# Altium footprint library SparkFun-Retired.PCBLIB: 302 footprints (part 3 of 19)
Each footprint in its own frame and in the unit in brackets; x right, y up, seen from the top. Pads: shape width x height; smd on the part's side, far side on the other; paste and mask are expansions set on the pad; w line width, h text height; cw(c..) or ccw(c..) is an arc to the next point about the centre after c.
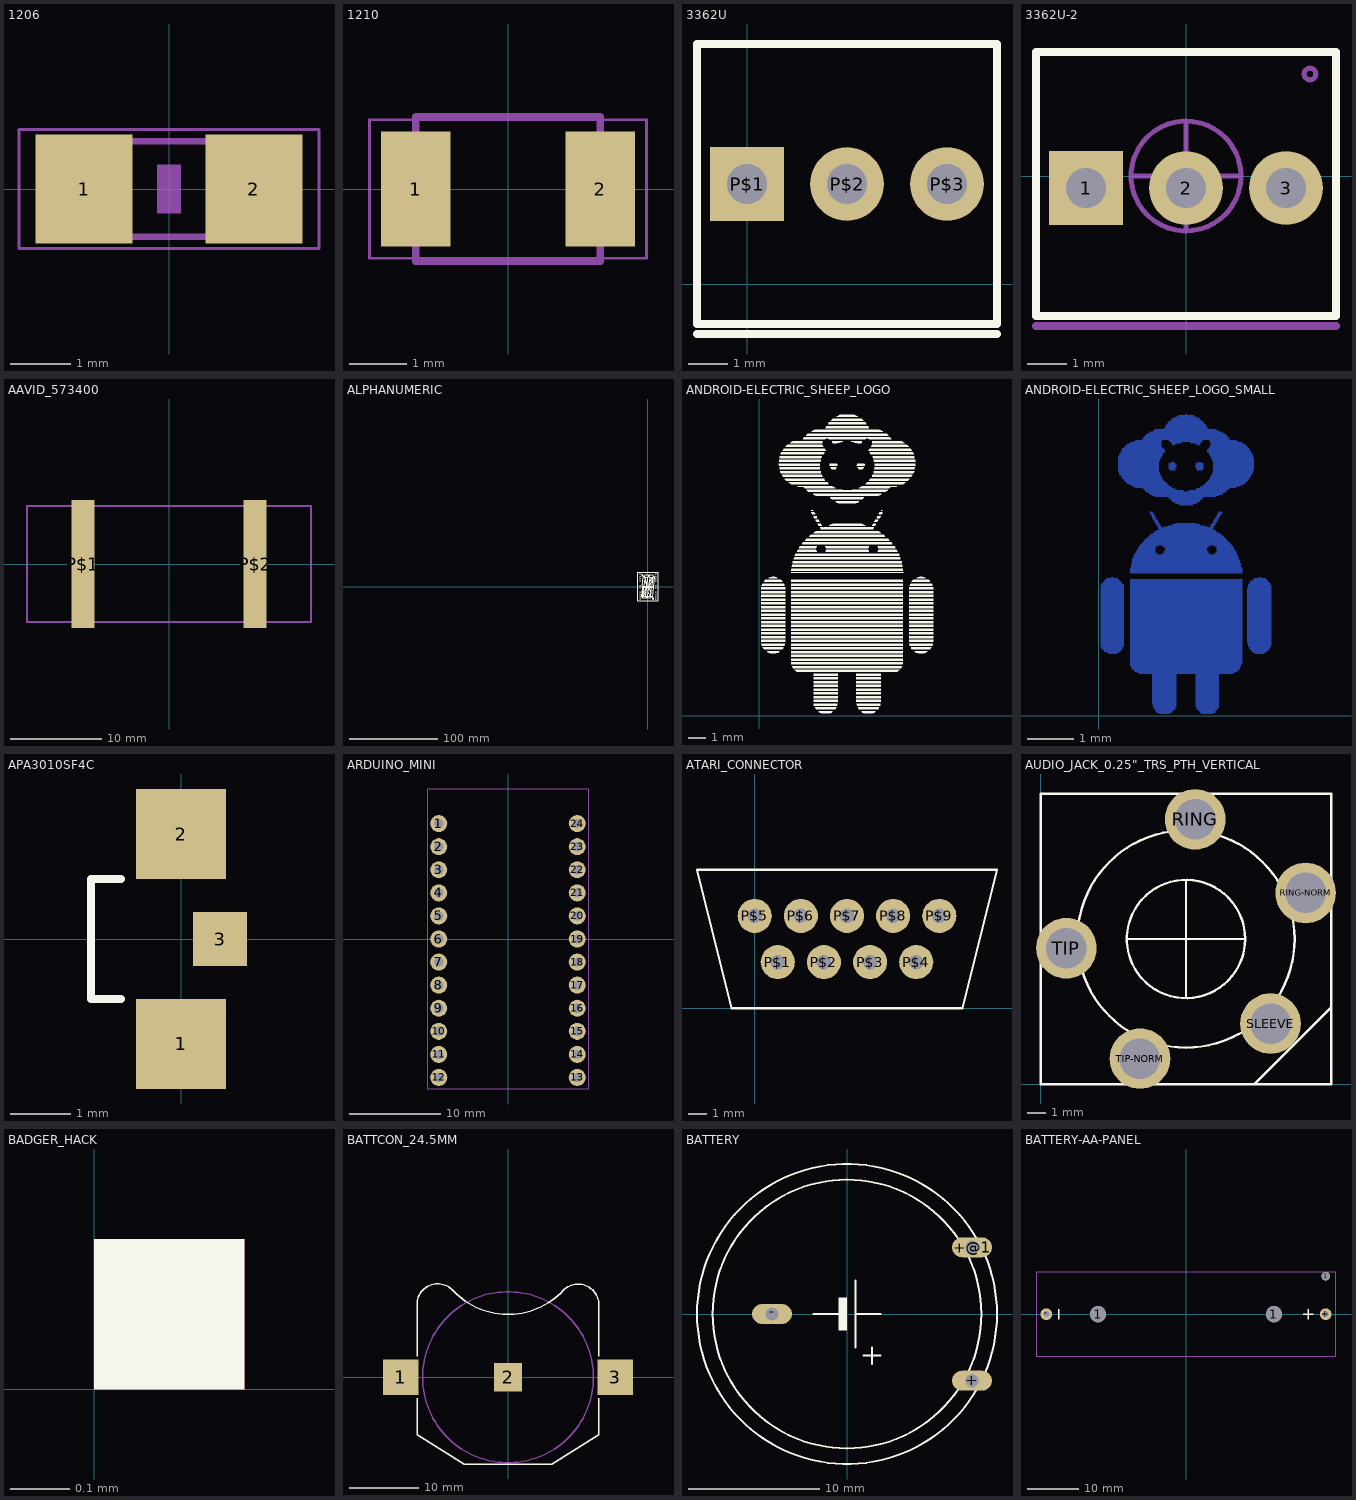
[diagram p2: the footprints below, top view; thin cyan lines are the x and y axes]

## 1206 [mil]
pads (2):
  rect 62.99x70.87 smd: 1(-55.12,0) 2(55.12,0)
Mechanical 6:
  rectangle: -7.87,-15.75 7.87,15.75
Mechanical 16:
  rectangle: -67,-33.5 -37.47,33.43
  rectangle: 37.47,-33.43 67,33.5
  lines w4: -37.99,-30.98 37.99,-30.98 ; -37.99,30.98 37.99,30.98
Mechanical 27:
  lines w2: -97.36,-38.7 97.36,-38.7 97.36,38.7 -97.36,38.7 -97.36,-38.7

## 1210 [mm]
pads (2):
  rect 1.2x2 smd: 1(-1.6,0) 2(1.6,0)
Mechanical 16:
  lines w0.127: -1.6,-1.25 1.6,-1.25 1.6,1.25 -1.6,1.25 -1.6,-1.25
Mechanical 27:
  lines w0.051: -2.4,-1.2 2.4,-1.2 2.4,1.2 -2.4,1.2 -2.4,-1.2

## 3362U [mil]
pads (3):
  rect 74x74 hole 40: P$1(0,100)
  round 74 hole 40: P$2(100,100) P$3(200,100)
Top Overlay:
  lines w8: -50,-50 250,-50 ; -50,-40 250,-40 250,240 -50,240 -50,-40

## 3362U-2 [mil]
pads (3):
  rect 74x74 hole 40: 1(-100,-12)
  round 74 hole 40: 2(0,-12) 3(100,-12)
Top Overlay:
  lines w8: -150,-140 150,-140 150,124 -150,124 -150,-140
Mechanical 16:
  circle w5: c0,0 r55
  circle w5: c124,102 r5.83
  lines w5: -55,0 55,0 ; 0,-55 0,55
  lines w8: -150,-150 150,-150

## AAVID_573400 [mil]
pads (2):
  rect 100x550 smd: P$1(-370,0) P$2(370,0)
Mechanical 16:
  rectangle: -395,-250 -345,250
  rectangle: 345,-250 395,250
  lines w8: -610,-250 610,-250 610,250 -610,250 -610,-250

## ALPHANUMERIC [mil]
pads (20):
  round 66.93 hole 35.43: 1(-350,550) 2(-350,450) 3(-350,350) 4(-350,250) 6(-350,50) 7(-350,-50) 9(-350,-250) 10(-350,-350) 11(-350,-450) 12(-350,-550) 13(350,-550) 14(350,-450) 15(350,-350) 16(350,-250) 18(350,-50) 19(350,50) 21(350,250) 22(350,350) 23(350,450) 24(350,550)
Top Overlay:
  circle w8: c-250,510 r29.15
  circle w8: c230,-525 r26.93
  lines w8: -450,-650 450,-650 450,650 -450,650 -450,-650 ; -300,-425 -260,-35 -215,-35 -190,-70 -225,-400 -275,-450 -300,-425 ; -270,-485 -230,-440 -110,-440 -75,-475 -75,-505 -250,-505 -270,-485 ; -255,5 -210,5 -175,45 -135,400 -190,460 -210,425 -255,5 ; -205,-400 -95,-215 -75,-75 -190,-255 -205,-400 ; -195,-15 -170,-50 -75,-50 -30,-15 -60,25 -160,25 -195,-15 ; -175,475 -125,425 -5,425 35,465 35,500 -150,500 -175,475 ; -130,255 ccw(c-6492.5,1007.5) -115,395 -40,180 -55,50 -130,255 ; -100,-415 -65,-450 -30,-415 15,-75 -10,-25 -55,-70 -100,-415 ; -50,-505 -50,-475 -20,-440 105,-440 155,-480 135,-505 -50,-505 ; -35,45 -5,0 30,45 75,415 45,450 5,410 -35,45 ; 15,-15 40,-55 145,-55 185,-15 150,25 55,25 15,-15 ; 20,-225 105,-415 120,-280 35,-75 20,-225 ; 50,45 185,265 200,395 70,180 50,45 ; 55,460 55,500 240,500 255,470 220,425 90,425 55,460 ; 125,-420 170,-455 195,-440 245,-30 200,-30 160,-70 125,-420 ; 175,40 205,0 250,0 300,415 275,460 220,400 175,40

## ANDROID-ELECTRIC_SHEEP_LOGO [mil]
Top Overlay:
  drawing of 1370 lines, arcs and shapes, not listed

## ANDROID-ELECTRIC_SHEEP_LOGO_SMALL [mil]
Bottom Layer:
  rectangle: 51.5,1.5 60.5,2.5
  rectangle: 87.5,1.5 97.5,2.5
  rectangle: 49.5,2.5 62.5,3.5
  rectangle: 86.5,2.5 99.5,3.5
  rectangle: 48.5,3.5 63.5,4.5
  rectangle: 85.5,3.5 99.5,4.5
  rectangle: 47.5,4.5 64.5,5.5
  rectangle: 84.5,4.5 101.5,5.5
  rectangle: 47.5,5.5 65.5,6.5
  rectangle: 83.5,5.5 101.5,6.5
  rectangle: 46.5,6.5 65.5,7.5
  rectangle: 83.5,6.5 102.5,7.5
  rectangle: 46.5,7.5 66.5,8.5
  rectangle: 82.5,7.5 102.5,8.5
  rectangle: 46.5,8.5 66.5,9.5
  rectangle: 82.5,8.5 102.5,9.5
  rectangle: 45.5,9.5 66.5,10.5
  rectangle: 82.5,9.5 102.5,10.5
  rectangle: 45.5,10.5 66.5,11.5
  rectangle: 82.5,10.5 102.5,11.5
  rectangle: 45.5,11.5 66.5,12.5
  rectangle: 82.5,11.5 102.5,12.5
  rectangle: 45.5,12.5 66.5,13.5
  rectangle: 82.5,12.5 102.5,13.5
  rectangle: 45.5,13.5 66.5,14.5
  rectangle: 82.5,13.5 102.5,14.5
  rectangle: 45.5,14.5 66.5,15.5
  rectangle: 82.5,14.5 102.5,15.5
  rectangle: 45.5,15.5 66.5,16.5
  rectangle: 82.5,15.5 102.5,16.5
  rectangle: 45.5,16.5 66.5,17.5
  rectangle: 82.5,16.5 102.5,17.5
  rectangle: 45.5,17.5 66.5,18.5
  rectangle: 82.5,17.5 102.5,18.5
  rectangle: 45.5,18.5 66.5,19.5
  rectangle: 82.5,18.5 102.5,19.5
  rectangle: 45.5,19.5 66.5,20.5
  rectangle: 82.5,19.5 102.5,20.5
  rectangle: 45.5,20.5 66.5,21.5
  rectangle: 82.5,20.5 102.5,21.5
  rectangle: 45.5,21.5 66.5,22.5
  rectangle: 82.5,21.5 102.5,22.5
  rectangle: 45.5,22.5 66.5,23.5
  rectangle: 82.5,22.5 102.5,23.5
  rectangle: 45.5,23.5 66.5,24.5
  rectangle: 82.5,23.5 102.5,24.5
  rectangle: 45.5,24.5 66.5,25.5
  rectangle: 82.5,24.5 102.5,25.5
  rectangle: 45.5,25.5 66.5,26.5
  rectangle: 82.5,25.5 102.5,26.5
  rectangle: 45.5,26.5 66.5,27.5
  rectangle: 82.5,26.5 102.5,27.5
  rectangle: 45.5,27.5 66.5,28.5
  rectangle: 82.5,27.5 102.5,28.5
  rectangle: 45.5,28.5 66.5,29.5
  rectangle: 82.5,28.5 102.5,29.5
  rectangle: 45.5,29.5 66.5,30.5
  rectangle: 82.5,29.5 102.5,30.5
  rectangle: 45.5,30.5 66.5,31.5
  rectangle: 82.5,30.5 102.5,31.5
  rectangle: 45.5,31.5 66.5,32.5
  rectangle: 82.5,31.5 102.5,32.5
  rectangle: 45.5,32.5 66.5,33.5
  rectangle: 82.5,32.5 102.5,33.5
  rectangle: 45.5,33.5 66.5,34.5
  rectangle: 82.5,33.5 102.5,34.5
  rectangle: 45.5,34.5 66.5,35.5
  rectangle: 82.5,34.5 102.5,35.5
  rectangle: 34.5,35.5 114.5,36.5
  rectangle: 32.5,36.5 116.5,37.5
  rectangle: 30.5,37.5 118.5,38.5
  rectangle: 29.5,38.5 119.5,39.5
  rectangle: 28.5,39.5 120.5,40.5
  rectangle: 27.5,40.5 120.5,41.5
  rectangle: 27.5,41.5 121.5,42.5
  rectangle: 26.5,42.5 121.5,43.5
  rectangle: 26.5,43.5 121.5,44.5
  rectangle: 26.5,44.5 122.5,45.5
  rectangle: 26.5,45.5 122.5,46.5
  rectangle: 26.5,46.5 122.5,47.5
  rectangle: 26.5,47.5 122.5,48.5
  rectangle: 26.5,48.5 122.5,49.5
  rectangle: 26.5,49.5 122.5,50.5
  rectangle: 26.5,50.5 122.5,51.5
  rectangle: 26.5,51.5 122.5,52.5
  rectangle: 8.5,52.5 15.5,53.5
  rectangle: 26.5,52.5 122.5,53.5
  rectangle: 133.5,52.5 140.5,53.5
  rectangle: 6.5,53.5 17.5,54.5
  rectangle: 26.5,53.5 122.5,54.5
  rectangle: 131.5,53.5 142.5,54.5
  rectangle: 4.5,54.5 18.5,55.5
  rectangle: 26.5,54.5 122.5,55.5
  rectangle: 130.5,54.5 143.5,55.5
  rectangle: 3.5,55.5 19.5,56.5
  rectangle: 26.5,55.5 122.5,56.5
  rectangle: 129.5,55.5 145.5,56.5
  rectangle: 2.5,56.5 20.5,57.5
  rectangle: 26.5,56.5 122.5,57.5
  rectangle: 128.5,56.5 145.5,57.5
  rectangle: 2.5,57.5 20.5,58.5
  rectangle: 26.5,57.5 122.5,58.5
  rectangle: 128.5,57.5 146.5,58.5
  rectangle: 1.5,58.5 21.5,59.5
  rectangle: 26.5,58.5 122.5,59.5
  rectangle: 127.5,58.5 146.5,59.5
  rectangle: 1.5,59.5 21.5,60.5
  rectangle: 26.5,59.5 122.5,60.5
  rectangle: 127.5,59.5 147.5,60.5
  rectangle: 1.5,60.5 21.5,61.5
  rectangle: 26.5,60.5 122.5,61.5
  rectangle: 127.5,60.5 147.5,61.5
  rectangle: 1.5,61.5 21.5,62.5
  rectangle: 26.5,61.5 122.5,62.5
  rectangle: 126.5,61.5 147.5,62.5
  rectangle: 1.5,62.5 21.5,63.5
  rectangle: 26.5,62.5 122.5,63.5
  rectangle: 126.5,62.5 147.5,63.5
  rectangle: 1.5,63.5 21.5,64.5
  rectangle: 26.5,63.5 122.5,64.5
  rectangle: 126.5,63.5 147.5,64.5
  rectangle: 1.5,64.5 21.5,65.5
  rectangle: 26.5,64.5 122.5,65.5
  rectangle: 126.5,64.5 147.5,65.5
  rectangle: 1.5,65.5 21.5,66.5
  rectangle: 26.5,65.5 122.5,66.5
  rectangle: 126.5,65.5 147.5,66.5
  rectangle: 1.5,66.5 21.5,67.5
  rectangle: 26.5,66.5 122.5,67.5
  rectangle: 126.5,66.5 147.5,67.5
  rectangle: 1.5,67.5 21.5,68.5
  rectangle: 26.5,67.5 122.5,68.5
  rectangle: 126.5,67.5 147.5,68.5
  rectangle: 1.5,68.5 21.5,69.5
  rectangle: 26.5,68.5 122.5,69.5
  rectangle: 126.5,68.5 147.5,69.5
  rectangle: 1.5,69.5 21.5,70.5
  rectangle: 26.5,69.5 122.5,70.5
  rectangle: 126.5,69.5 147.5,70.5
  rectangle: 1.5,70.5 21.5,71.5
  rectangle: 26.5,70.5 122.5,71.5
  rectangle: 126.5,70.5 147.5,71.5
  rectangle: 1.5,71.5 21.5,72.5
  rectangle: 26.5,71.5 122.5,72.5
  rectangle: 126.5,71.5 147.5,72.5
  rectangle: 1.5,72.5 21.5,73.5
  rectangle: 26.5,72.5 122.5,73.5
  rectangle: 126.5,72.5 147.5,73.5
  rectangle: 1.5,73.5 21.5,74.5
  rectangle: 26.5,73.5 122.5,74.5
  rectangle: 126.5,73.5 147.5,74.5
  rectangle: 1.5,74.5 21.5,75.5
  rectangle: 26.5,74.5 122.5,75.5
  rectangle: 126.5,74.5 147.5,75.5
  rectangle: 1.5,75.5 21.5,76.5
  rectangle: 26.5,75.5 122.5,76.5
  rectangle: 126.5,75.5 147.5,76.5
  rectangle: 1.5,76.5 21.5,77.5
  rectangle: 26.5,76.5 122.5,77.5
  rectangle: 126.5,76.5 147.5,77.5
  rectangle: 1.5,77.5 21.5,78.5
  rectangle: 26.5,77.5 122.5,78.5
  rectangle: 126.5,77.5 147.5,78.5
  rectangle: 1.5,78.5 21.5,79.5
  rectangle: 26.5,78.5 122.5,79.5
  rectangle: 126.5,78.5 147.5,79.5
  rectangle: 1.5,79.5 21.5,80.5
  rectangle: 26.5,79.5 122.5,80.5
  rectangle: 126.5,79.5 147.5,80.5
  rectangle: 1.5,80.5 21.5,81.5
  rectangle: 26.5,80.5 122.5,81.5
  rectangle: 126.5,80.5 147.5,81.5
  rectangle: 1.5,81.5 21.5,82.5
  rectangle: 26.5,81.5 122.5,82.5
  rectangle: 126.5,81.5 147.5,82.5
  rectangle: 1.5,82.5 21.5,83.5
  rectangle: 26.5,82.5 122.5,83.5
  rectangle: 126.5,82.5 147.5,83.5
  rectangle: 1.5,83.5 21.5,84.5
  rectangle: 26.5,83.5 122.5,84.5
  rectangle: 126.5,83.5 147.5,84.5
  rectangle: 1.5,84.5 21.5,85.5
  rectangle: 26.5,84.5 122.5,85.5
  rectangle: 126.5,84.5 147.5,85.5
  rectangle: 1.5,85.5 21.5,86.5
  rectangle: 26.5,85.5 122.5,86.5
  rectangle: 126.5,85.5 147.5,86.5
  rectangle: 1.5,86.5 21.5,87.5
  rectangle: 26.5,86.5 122.5,87.5
  rectangle: 126.5,86.5 147.5,87.5
  rectangle: 1.5,87.5 21.5,88.5
  rectangle: 26.5,87.5 122.5,88.5
  rectangle: 126.5,87.5 147.5,88.5
  rectangle: 1.5,88.5 21.5,89.5
  rectangle: 26.5,88.5 122.5,89.5
  rectangle: 126.5,88.5 147.5,89.5
  rectangle: 1.5,89.5 21.5,90.5
  rectangle: 26.5,89.5 122.5,90.5
  rectangle: 126.5,89.5 147.5,90.5
  rectangle: 1.5,90.5 21.5,91.5
  rectangle: 26.5,90.5 122.5,91.5
  rectangle: 126.5,90.5 147.5,91.5
  rectangle: 1.5,91.5 21.5,92.5
  rectangle: 26.5,91.5 122.5,92.5
  rectangle: 126.5,91.5 147.5,92.5
  rectangle: 1.5,92.5 21.5,93.5
  rectangle: 26.5,92.5 122.5,93.5
  rectangle: 126.5,92.5 147.5,93.5
  rectangle: 1.5,93.5 21.5,94.5
  rectangle: 26.5,93.5 122.5,94.5
  rectangle: 126.5,93.5 147.5,94.5
  rectangle: 1.5,94.5 21.5,95.5
  rectangle: 26.5,94.5 122.5,95.5
  rectangle: 126.5,94.5 147.5,95.5
  rectangle: 1.5,95.5 21.5,96.5
  rectangle: 26.5,95.5 122.5,96.5
  rectangle: 126.5,95.5 147.5,96.5
  rectangle: 1.5,96.5 21.5,97.5
  rectangle: 26.5,96.5 122.5,97.5
  rectangle: 126.5,96.5 147.5,97.5
  rectangle: 1.5,97.5 21.5,98.5
  rectangle: 26.5,97.5 122.5,98.5
  rectangle: 126.5,97.5 147.5,98.5
  rectangle: 1.5,98.5 21.5,99.5
  rectangle: 26.5,98.5 122.5,99.5
  rectangle: 126.5,98.5 147.5,99.5
  rectangle: 1.5,99.5 21.5,100.5
  rectangle: 26.5,99.5 122.5,100.5
  rectangle: 126.5,99.5 147.5,100.5
  rectangle: 1.5,100.5 21.5,101.5
  rectangle: 26.5,100.5 122.5,101.5
  rectangle: 126.5,100.5 147.5,101.5
  rectangle: 1.5,101.5 21.5,102.5
  rectangle: 26.5,101.5 122.5,102.5
  rectangle: 126.5,101.5 147.5,102.5
  rectangle: 1.5,102.5 21.5,103.5
  rectangle: 26.5,102.5 122.5,103.5
  rectangle: 126.5,102.5 147.5,103.5
  rectangle: 1.5,103.5 21.5,104.5
  rectangle: 26.5,103.5 122.5,104.5
  rectangle: 126.5,103.5 147.5,104.5
  rectangle: 1.5,104.5 21.5,105.5
  rectangle: 26.5,104.5 122.5,105.5
  rectangle: 126.5,104.5 147.5,105.5
  rectangle: 1.5,105.5 21.5,106.5
  rectangle: 26.5,105.5 122.5,106.5
  rectangle: 126.5,105.5 147.5,106.5
  rectangle: 1.5,106.5 21.5,107.5
  rectangle: 26.5,106.5 122.5,107.5
  rectangle: 126.5,106.5 147.5,107.5
  rectangle: 1.5,107.5 21.5,108.5
  rectangle: 26.5,107.5 122.5,108.5
  rectangle: 126.5,107.5 147.5,108.5
  rectangle: 1.5,108.5 21.5,109.5
  rectangle: 26.5,108.5 122.5,109.5
  rectangle: 126.5,108.5 147.5,109.5
  rectangle: 1.5,109.5 21.5,110.5
  rectangle: 26.5,109.5 122.5,110.5
  rectangle: 127.5,109.5 147.5,110.5
  rectangle: 1.5,110.5 21.5,111.5
  rectangle: 26.5,110.5 122.5,111.5
  rectangle: 127.5,110.5 147.5,111.5
  rectangle: 2.5,111.5 21.5,112.5
  rectangle: 26.5,111.5 122.5,112.5
  rectangle: 127.5,111.5 146.5,112.5
  rectangle: 2.5,112.5 20.5,113.5
  rectangle: 26.5,112.5 122.5,113.5
  rectangle: 128.5,112.5 146.5,113.5
  rectangle: 3.5,113.5 19.5,114.5
  rectangle: 26.5,113.5 122.5,114.5
  rectangle: 128.5,113.5 145.5,114.5
  rectangle: 4.5,114.5 18.5,115.5
  rectangle: 26.5,114.5 122.5,115.5
  rectangle: 129.5,114.5 144.5,115.5
  rectangle: 5.5,115.5 17.5,116.5
  rectangle: 26.5,115.5 122.5,116.5
  rectangle: 131.5,115.5 143.5,116.5
  rectangle: 6.5,116.5 16.5,117.5
  rectangle: 132.5,116.5 142.5,117.5
  rectangle: 10.5,117.5 12.5,118.5
  rectangle: 136.5,117.5 138.5,118.5
  rectangle: 26.5,121.5 122.5,122.5
  rectangle: 26.5,122.5 122.5,123.5
  rectangle: 26.5,123.5 122.5,124.5
  rectangle: 26.5,124.5 122.5,125.5
  rectangle: 26.5,125.5 122.5,126.5
  rectangle: 27.5,126.5 121.5,127.5
  rectangle: 27.5,127.5 121.5,128.5
  rectangle: 27.5,128.5 121.5,129.5
  rectangle: 27.5,129.5 121.5,130.5
  rectangle: 28.5,130.5 120.5,131.5
  rectangle: 28.5,131.5 120.5,132.5
  rectangle: 28.5,132.5 120.5,133.5
  rectangle: 28.5,133.5 119.5,134.5
  rectangle: 29.5,134.5 119.5,135.5
  rectangle: 29.5,135.5 119.5,136.5
  rectangle: 29.5,136.5 118.5,137.5
  rectangle: 30.5,137.5 50.5,138.5
  rectangle: 53.5,137.5 95.5,138.5
  rectangle: 98.5,137.5 118.5,138.5
  rectangle: 31.5,138.5 49.5,139.5
  rectangle: 55.5,138.5 93.5,139.5
  rectangle: 99.5,138.5 117.5,139.5
  rectangle: 31.5,139.5 48.5,140.5
  rectangle: 55.5,139.5 93.5,140.5
  rectangle: 100.5,139.5 117.5,140.5
  rectangle: 32.5,140.5 48.5,141.5
  rectangle: 56.5,140.5 92.5,141.5
  rectangle: 100.5,140.5 116.5,141.5
  rectangle: 32.5,141.5 48.5,142.5
  rectangle: 56.5,141.5 92.5,142.5
  rectangle: 100.5,141.5 116.5,142.5
  rectangle: 33.5,142.5 48.5,143.5
  rectangle: 56.5,142.5 92.5,143.5
  rectangle: 100.5,142.5 115.5,143.5
  rectangle: 34.5,143.5 48.5,144.5
  rectangle: 55.5,143.5 93.5,144.5
  rectangle: 100.5,143.5 114.5,144.5
  rectangle: 34.5,144.5 50.5,145.5
  rectangle: 54.5,144.5 94.5,145.5
  rectangle: 98.5,144.5 114.5,145.5
  rectangle: 35.5,145.5 113.5,146.5
  rectangle: 36.5,146.5 112.5,147.5
  rectangle: 37.5,147.5 111.5,148.5
  rectangle: 38.5,148.5 110.5,149.5
  rectangle: 38.5,149.5 109.5,150.5
  rectangle: 40.5,150.5 108.5,151.5
  rectangle: 41.5,151.5 107.5,152.5
  rectangle: 42.5,152.5 106.5,153.5
  rectangle: 43.5,153.5 105.5,154.5
  rectangle: 44.5,154.5 104.5,155.5
  rectangle: 46.5,155.5 102.5,156.5
  rectangle: 47.5,156.5 100.5,157.5
  rectangle: 49.5,157.5 99.5,158.5
  rectangle: 51.5,158.5 97.5,159.5
  rectangle: 50.5,159.5 97.5,160.5
  rectangle: 50.5,160.5 53.5,161.5
  rectangle: 55.5,160.5 93.5,161.5
  rectangle: 94.5,160.5 98.5,161.5
  rectangle: 49.5,161.5 53.5,162.5
  rectangle: 58.5,161.5 90.5,162.5
  rectangle: 95.5,161.5 98.5,162.5
  rectangle: 49.5,162.5 52.5,163.5
  rectangle: 62.5,162.5 86.5,163.5
  rectangle: 95.5,162.5 99.5,163.5
  rectangle: 48.5,163.5 51.5,164.5
  rectangle: 65.5,163.5 83.5,164.5
  rectangle: 96.5,163.5 99.5,164.5
  rectangle: 47.5,164.5 51.5,165.5
  rectangle: 97.5,164.5 100.5,165.5
  rectangle: 47.5,165.5 50.5,166.5
  rectangle: 97.5,165.5 101.5,166.5
  rectangle: 46.5,166.5 50.5,167.5
  rectangle: 98.5,166.5 101.5,167.5
  rectangle: 46.5,167.5 49.5,168.5
  rectangle: 98.5,167.5 102.5,168.5
  rectangle: 45.5,168.5 48.5,169.5
  rectangle: 99.5,168.5 102.5,169.5
  rectangle: 45.5,169.5 48.5,170.5
  rectangle: 100.5,169.5 103.5,170.5
  rectangle: 44.5,170.5 47.5,171.5
  rectangle: 100.5,170.5 104.5,171.5
  rectangle: 44.5,171.5 47.5,172.5
  rectangle: 101.5,171.5 104.5,172.5
  rectangle: 43.5,172.5 46.5,173.5
  rectangle: 101.5,172.5 105.5,173.5
  rectangle: 43.5,173.5 46.5,174.5
  rectangle: 102.5,173.5 105.5,174.5
  rectangle: 68.5,179.5 80.5,180.5
  rectangle: 65.5,180.5 83.5,181.5
  rectangle: 64.5,181.5 84.5,182.5
  rectangle: 62.5,182.5 86.5,183.5
  rectangle: 61.5,183.5 87.5,184.5
  rectangle: 60.5,184.5 88.5,185.5
  rectangle: 59.5,185.5 89.5,186.5
  rectangle: 47.5,186.5 100.5,187.5
  rectangle: 45.5,187.5 102.5,188.5
  rectangle: 43.5,188.5 105.5,189.5
  rectangle: 42.5,189.5 106.5,190.5
  rectangle: 40.5,190.5 108.5,191.5
  rectangle: 39.5,191.5 72.5,192.5
  rectangle: 76.5,191.5 109.5,192.5
  rectangle: 38.5,192.5 66.5,193.5
  rectangle: 82.5,192.5 110.5,193.5
  rectangle: 37.5,193.5 64.5,194.5
  rectangle: 83.5,193.5 111.5,194.5
  rectangle: 30.5,194.5 62.5,195.5
  rectangle: 86.5,194.5 117.5,195.5
  rectangle: 28.5,195.5 60.5,196.5
  rectangle: 88.5,195.5 120.5,196.5
  rectangle: 26.5,196.5 59.5,197.5
  rectangle: 89.5,196.5 122.5,197.5
  rectangle: 24.5,197.5 58.5,198.5
  rectangle: 90.5,197.5 124.5,198.5
  rectangle: 23.5,198.5 57.5,199.5
  rectangle: 91.5,198.5 125.5,199.5
  rectangle: 22.5,199.5 56.5,200.5
  rectangle: 92.5,199.5 126.5,200.5
  rectangle: 21.5,200.5 55.5,201.5
  rectangle: 93.5,200.5 127.5,201.5
  rectangle: 20.5,201.5 54.5,202.5
  rectangle: 94.5,201.5 128.5,202.5
  rectangle: 19.5,202.5 54.5,203.5
  rectangle: 94.5,202.5 128.5,203.5
  rectangle: 19.5,203.5 53.5,204.5
  rectangle: 95.5,203.5 129.5,204.5
  rectangle: 18.5,204.5 53.5,205.5
  rectangle: 95.5,204.5 130.5,205.5
  rectangle: 17.5,205.5 52.5,206.5
  rectangle: 96.5,205.5 130.5,206.5
  rectangle: 17.5,206.5 52.5,207.5
  rectangle: 96.5,206.5 131.5,207.5
  rectangle: 17.5,207.5 51.5,208.5
  rectangle: 97.5,207.5 131.5,208.5
  rectangle: 16.5,208.5 51.5,209.5
  rectangle: 97.5,208.5 131.5,209.5
  rectangle: 16.5,209.5 51.5,210.5
  rectangle: 60.5,209.5 65.5,210.5
  rectangle: 83.5,209.5 88.5,210.5
  rectangle: 97.5,209.5 132.5,210.5
  rectangle: 16.5,210.5 51.5,211.5
  rectangle: 59.5,210.5 65.5,211.5
  rectangle: 83.5,210.5 89.5,211.5
  rectangle: 97.5,210.5 132.5,211.5
  rectangle: 16.5,211.5 51.5,212.5
  rectangle: 59.5,211.5 66.5,212.5
  rectangle: 82.5,211.5 89.5,212.5
  rectangle: 97.5,211.5 132.5,212.5
  rectangle: 16.5,212.5 51.5,213.5
  rectangle: 59.5,212.5 66.5,213.5
  rectangle: 82.5,212.5 89.5,213.5
  rectangle: 97.5,212.5 132.5,213.5
  rectangle: 16.5,213.5 51.5,214.5
  rectangle: 59.5,213.5 66.5,214.5
  rectangle: 82.5,213.5 89.5,214.5
  rectangle: 97.5,213.5 132.5,214.5
  rectangle: 16.5,214.5 51.5,215.5
  rectangle: 59.5,214.5 65.5,215.5
  rectangle: 82.5,214.5 89.5,215.5
  rectangle: 97.5,214.5 132.5,215.5
  rectangle: 16.5,215.5 51.5,216.5
  rectangle: 61.5,215.5 64.5,216.5
  rectangle: 84.5,215.5 87.5,216.5
  rectangle: 97.5,215.5 132.5,216.5
  rectangle: 16.5,216.5 51.5,217.5
  rectangle: 97.5,216.5 132.5,217.5
  rectangle: 16.5,217.5 52.5,218.5
  rectangle: 96.5,217.5 132.5,218.5
  rectangle: 16.5,218.5 52.5,219.5
  rectangle: 96.5,218.5 132.5,219.5
  rectangle: 16.5,219.5 53.5,220.5
  rectangle: 95.5,219.5 132.5,220.5
  rectangle: 16.5,220.5 53.5,221.5
  rectangle: 95.5,220.5 131.5,221.5
  rectangle: 17.5,221.5 54.5,222.5
  rectangle: 94.5,221.5 131.5,222.5
  rectangle: 17.5,222.5 54.5,223.5
  rectangle: 94.5,222.5 131.5,223.5
  rectangle: 18.5,223.5 55.5,224.5
  rectangle: 93.5,223.5 130.5,224.5
  rectangle: 18.5,224.5 56.5,225.5
  rectangle: 92.5,224.5 130.5,225.5
  rectangle: 19.5,225.5 56.5,226.5
  rectangle: 92.5,225.5 129.5,226.5
  rectangle: 19.5,226.5 56.5,227.5
  rectangle: 92.5,226.5 128.5,227.5
  rectangle: 20.5,227.5 55.5,228.5
  rectangle: 93.5,227.5 128.5,228.5
  rectangle: 21.5,228.5 54.5,229.5
  rectangle: 94.5,228.5 127.5,229.5
  rectangle: 22.5,229.5 53.5,230.5
  rectangle: 94.5,229.5 126.5,230.5
  rectangle: 23.5,230.5 53.5,231.5
  rectangle: 62.5,230.5 64.5,231.5
  rectangle: 84.5,230.5 86.5,231.5
  rectangle: 95.5,230.5 125.5,231.5
  rectangle: 24.5,231.5 53.5,232.5
  rectangle: 62.5,231.5 66.5,232.5
  rectangle: 82.5,231.5 86.5,232.5
  rectangle: 95.5,231.5 124.5,232.5
  rectangle: 26.5,232.5 53.5,233.5
  rectangle: 61.5,232.5 70.5,233.5
  rectangle: 78.5,232.5 87.5,233.5
  rectangle: 95.5,232.5 122.5,233.5
  rectangle: 29.5,233.5 53.5,234.5
  rectangle: 60.5,233.5 88.5,234.5
  rectangle: 94.5,233.5 119.5,234.5
  rectangle: 31.5,234.5 54.5,235.5
  rectangle: 59.5,234.5 88.5,235.5
  rectangle: 94.5,234.5 117.5,235.5
  rectangle: 37.5,235.5 111.5,236.5
  rectangle: 37.5,236.5 111.5,237.5
  rectangle: 38.5,237.5 110.5,238.5
  rectangle: 39.5,238.5 109.5,239.5
  rectangle: 40.5,239.5 108.5,240.5
  rectangle: 41.5,240.5 107.5,241.5
  rectangle: 43.5,241.5 105.5,242.5
  rectangle: 46.5,242.5 102.5,243.5
  rectangle: 47.5,243.5 100.5,244.5
  rectangle: 55.5,244.5 93.5,245.5
  rectangle: 56.5,245.5 92.5,246.5
  rectangle: 56.5,246.5 92.5,247.5
  rectangle: 57.5,247.5 91.5,248.5
  rectangle: 58.5,248.5 90.5,249.5
  rectangle: 58.5,249.5 89.5,250.5
  rectangle: 59.5,250.5 89.5,251.5
  rectangle: 61.5,251.5 87.5,252.5
  rectangle: 61.5,252.5 86.5,253.5
  rectangle: 63.5,253.5 85.5,254.5
  rectangle: 65.5,254.5 83.5,255.5
  rectangle: 67.5,255.5 81.5,256.5
  rectangle: 73.5,256.5 75.5,257.5

## APA3010SF4C [mm]
pads (3):
  rect 1.5x1.5 smd: 1(0,-1.75) 2(0,1.75)
  rect 0.9x0.9 smd: 3(0.65,0)
Top Overlay:
  lines w0.127: -1,-1 -1.5,-1 -1.5,1 -1,1

## ARDUINO_MINI [mil]
pads (24):
  round 74 hole 40: 1(-300,500) 2(-300,400) 3(-300,300) 4(-300,200) 5(-300,100) 6(-300,0) 7(-300,-100) 8(-300,-200) 9(-300,-300) 10(-300,-400) 11(-300,-500) 12(-300,-600) 13(300,-600) 14(300,-500) 15(300,-400) 16(300,-300) 17(300,-200) 18(300,-100) 19(300,0) 20(300,100) 21(300,200) 22(300,300) 23(300,400) 24(300,500)
Mechanical 16:
  lines w5: -350,-650 -350,650 350,650 350,-650 -350,-650

## ATARI_CONNECTOR [mil]
pads (9):
  round 74 hole 31.5: P$1(50,100) P$2(150,100) P$3(250,100) P$4(350,100) P$5(0,200) P$6(100,200) P$7(200,200) P$8(300,200) P$9(400,200)
Top Overlay:
  lines w5: -125,300 525,300 450,0 -50,0 -125,300

## AUDIO_JACK_0.25"_TRS_PTH_VERTICAL [mil]
pads (5):
  round 129.91 hole 86.61: RING(330.71,566.93) RING-NORM(566.93,409.45) SLEEVE(491.97,130.08) TIP(55.12,291.34) TIP-NORM(212.6,55.12)
Top Overlay:
  circle w5: c311.02,311.02 r126.57
  circle w5: c311.02,311.02 r232.28
  lines w5: 185.04,311.02 437.01,311.02 ; 311.02,185.04 311.02,437.01 ; 456.69,0 0,0 0,622.05 622.05,622.05 622.05,165.35 ; 456.69,0 622.05,0 622.05,165.35 ; 456.69,0 622.05,165.35

## BADGER_HACK [mil]
Top Layer:
  region: 0,0 10,0 10,10 0,10
  region: 0,0 10,0 10,10 0,10
  region: 0,0 10,0 10,10 0,10
  region: 0,0 10,0 10,10 0,10
  region: 0,0 10,0 10,10 0,10
  region: 0,0 10,0 10,10 0,10
  region: 0,0 10,0 10,10 0,10
Top Overlay:
  drawing of 50 lines, arcs and shapes, not listed
Top Solder:
  region: 0,0 10,0 10,10 0,10
  region: 0,0 10,0 10,10 0,10
  region: 0,0 10,0 10,10 0,10
  region: 0,0 10,0 10,10 0,10
  region: 0,0 10,0 10,10 0,10
  region: 0,0 10,0 10,10 0,10
  region: 0,0 10,0 10,10 0,10

## BATTCON_24.5MM [mil]
pads (3):
  rect 200x200 smd: 1(-605,0) 3(605,0)
  rect 160x160 smd: 2(0,0)
Top Overlay:
  lines w8: -513.39,-118.11 -513.39,-324.41 -245.67,-489.76 245.67,-489.76 513.39,-324.41 513.39,-118.11 ; -513.39,118.11 -513.39,408.66 cw(c-396.55,410.4) -308.66,487.4 ccw(c0.13,778.87) 312.6,491.34 ; 308.66,487.4 cw(c395.52,407.71) 513.39,408.66 513.39,118.11
Mechanical 16:
  circle w8: c0,0 r482.28

## BATTERY [mil]
pads (3):
  oval 120x60 hole 40: +(375,-200) +@1(375,200) -(-225,0)
Top Overlay:
  circle w6: c0,0 r450
  circle w6: c0,0 r403
  rectangle: -25,-50 0,50
  lines w6: -100,0 -25,0 ; 25,-100 25,0 ; 25,100 25,0 ; 50,-125 100,-125 ; 75,-150 75,-100 ; 100,0 25,0

## BATTERY-AA-PANEL [mil]
pads (5):
  round 125.2 hole 125.2: 1(-679.92,0) 1(679.92,0)
  round 66.93 hole 66.93: 1(1079.92,294.09)
  round 90.55 hole 46.06: +(1079.92,0) -(-1079.92,0)
Top Overlay:
  lines w9.84: -984.25,-39.37 -984.25,39.37 ; 905.51,0 984.25,0 ; 944.88,-39.37 944.88,39.37
Mechanical 14:
  text "(layout parts on top layer)" at -236.22,275.59 h37.2
Mechanical 16:
  lines w5: -1159.84,-325 -1159.84,325 1159.84,325 1159.84,-325 -1159.84,-325